# Altium footprint library ref-packages.PCBLIB: 1544 footprints (part 21 of 103)
Each footprint in its own frame and in the unit in brackets; x right, y up, seen from the top. Pads: shape width x height; smd on the part's side, far side on the other; paste and mask are expansions set on the pad; w line width, h text height; cw(c..) or ccw(c..) is an arc to the next point about the centre after c.
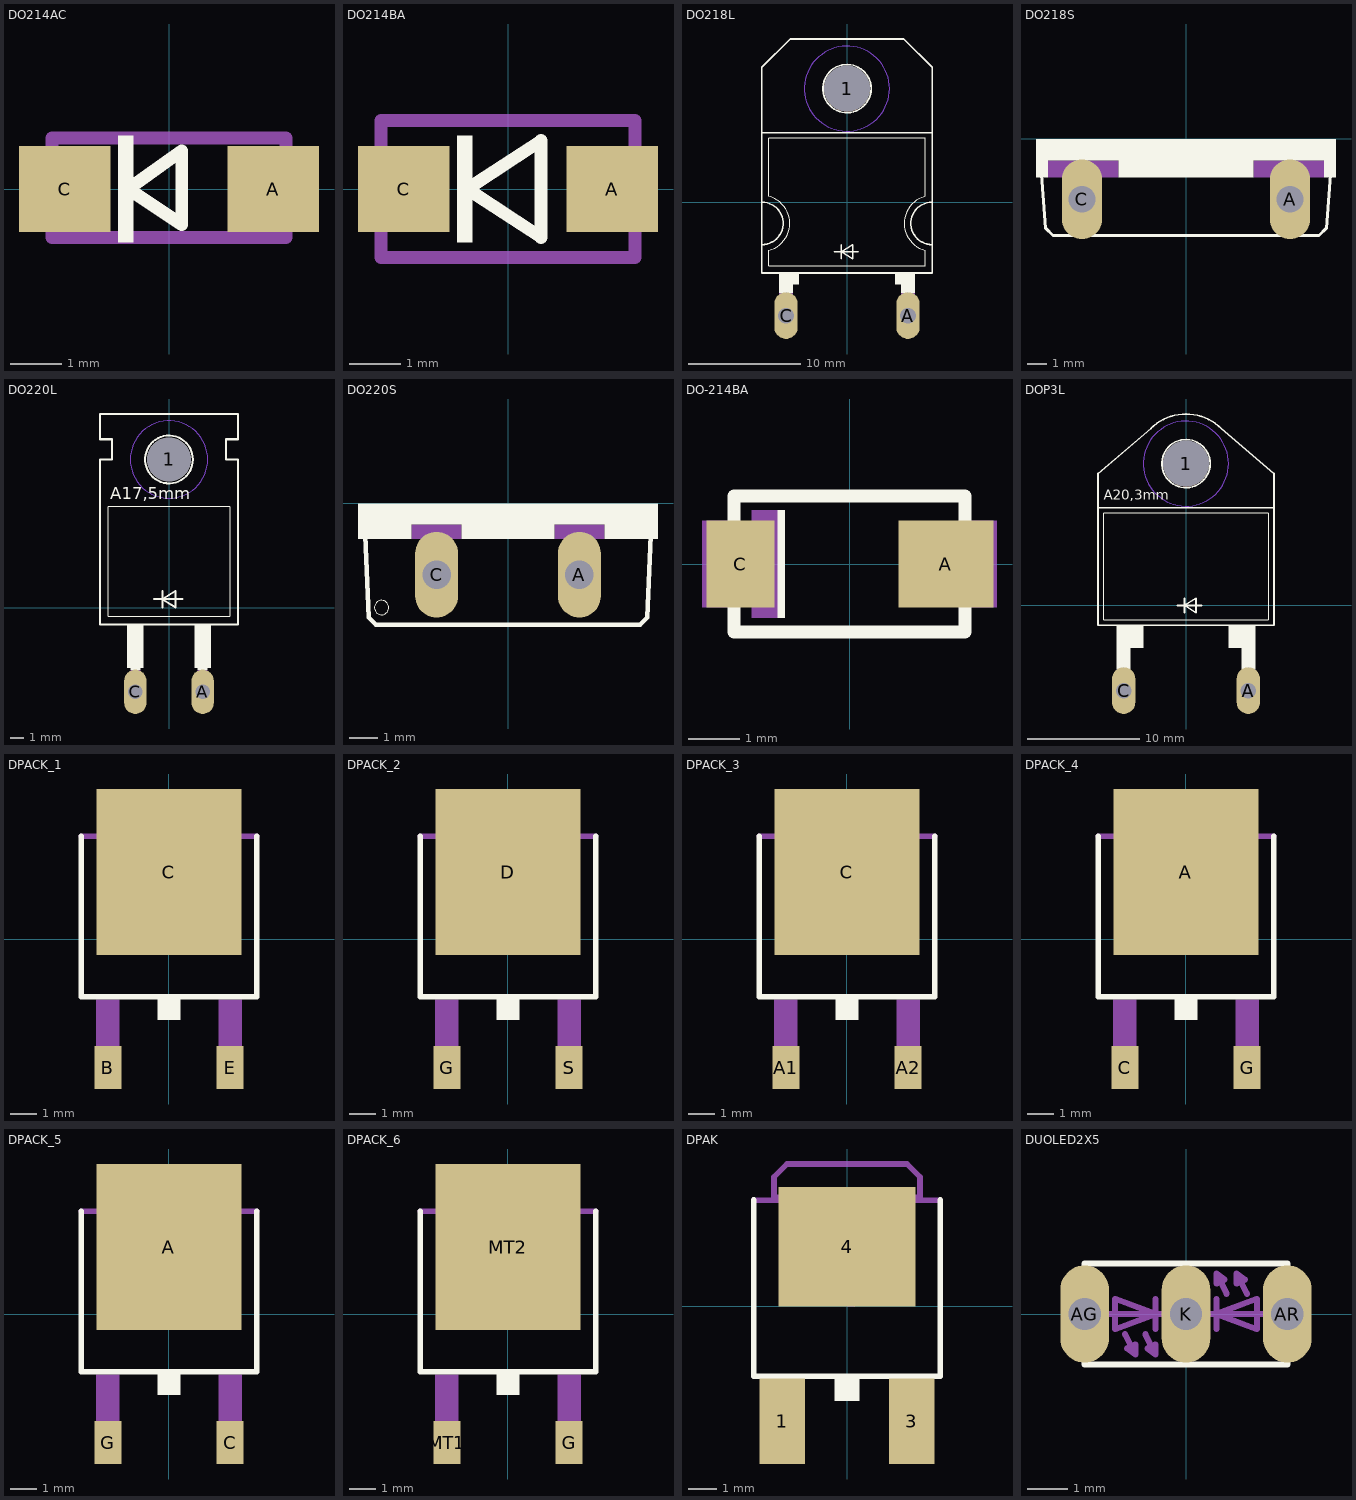
[diagram p20: the footprints below, top view; thin cyan lines are the x and y axes]

## DO214AC [mil]
pads (2):
  rect 70.87x66.93 smd: A(80.71,0) C(-80.71,0)
Top Overlay:
  rectangle: -39.37,-41.34 -27.56,41.34
  lines w10: -31.5,0 9.84,29.53 9.84,-27.56 -31.5,0
Mechanical 16:
  rectangle: -104.33,-27.56 -94.49,25.59
  rectangle: 94.49,-27.56 104.33,25.59
  lines w10: -90.55,-37.4 90.55,-37.4 90.55,39.37 -90.55,39.37 -90.55,-37.4

## DO214BA [mil]
pads (2):
  rect 70.87x66.93 smd: A(80.71,0) C(-80.71,0)
Top Overlay:
  rectangle: -39.37,-41.34 -27.56,41.34
  lines w10: -31.5,0 25.59,37.4 25.59,-37.4 -31.5,0
Mechanical 16:
  rectangle: -112.2,-27.56 -102.36,25.59
  rectangle: 102.36,-27.56 112.2,25.59
  lines w10: -98.43,-53.15 98.43,-53.15 98.43,53.15 -98.43,53.15 -98.43,-53.15

## DO218L [mil]
pads (3):
  round 162 hole 162: 1(0,400)
  oval 82.5x165 hole 55: A(215,-400) C(-215,-400)
Bottom Layer keep-out:
  circle w0: c0,400 r150
Top Overlay:
  circle w6: c0,400 r85
  rectangle: -240,-290 -170,-250
  rectangle: 170,-290 240,-250
  rectangle: -240,-320 -190,-250
  rectangle: 190,-320 240,-250
  lines w2: 273.71,19.65 ccw(c300,-75) 275,-169.99 275,-225 -275,-225 -275,-170 ccw(c-300,-75) -275,20 -275,225 275,225 275,20
  lines w6: -45,-175 -20,-175 ; -20,-200 -20,-175 ; -20,-150 -20,-175 ; 40,-175 -20,-175 ; -300,-150 -300,-250 300,-250 300,-150 ; -300,-150 -300,0 ; -300,-150 ccw(c-300,-75) -300,0 ; -300,0 -300,245 ; -300,245 300,245 ; -300,245 -300,475 -200,575 200,575 300,475 300,245 ; -20,-175 20,-200 20,-150 -20,-175 ; 300,-150 300,0 ; 300,-150 cw(c300,-75) 300,0 ; 300,0 300,245
Mechanical 16:
  rectangle: -240,-400 -190,-320
  rectangle: 190,-400 240,-320
Via Holes:
  circle w0: c0,400 r150

## DO218S [mil]
pads (2):
  oval 82.5x165 hole 55: A(215,-125) C(-215,-125)
Top Overlay:
  rectangle: -310,-45 310,0
  rectangle: -310,-80 -285,-45
  rectangle: 285,-80 310,-45
  rectangle: -140,-80 140,-45
  lines w6: -300,-60 -290,-185 -275,-200 275,-200 290,-185 300,-60
Mechanical 16:
  rectangle: 140,-80 285,-45
  rectangle: -285,-80 -140,-45

## DO220L [mil]
pads (3):
  round 130 hole 130: 1(0,440)
  oval 66x132 hole 44: A(100,-250) C(-100,-250)
Bottom Layer keep-out:
  circle w0: c0,440 r115
Top Overlay:
  circle w6: c0,440 r71
  rectangle: -125,-180 -75,-50
  rectangle: 75,-180 125,-50
  rectangle: 85,-185 115,-180
  rectangle: -115,-185 -85,-180
  lines w2: -180,-25 180,-25 180,300 -180,300 -180,-25
  lines w6: -45,25 -20,25 ; -20,0 -20,25 ; -20,50 -20,25 ; 40,25 -20,25 ; -20,25 20,0 20,50 -20,25 ; -205,-50 205,-50 205,440 170,440 170,500 205,500 205,575 -205,575 -205,500 -170,500 -170,440 -205,440 -205,-50
  text "A17,5mm" at -175,310 h60.45
Mechanical 16:
  rectangle: 85,-250 115,-185
  rectangle: -115,-250 -85,-185
Via Holes:
  circle w0: c0,440 r115

## DO220S [mil]
pads (2):
  oval 60x120 hole 40: A(100,-100) C(-100,-100)
Top Overlay:
  circle w0: c-177,-146 r10
  rectangle: -210,-30 210,0
  rectangle: -210,-50 -135,-30
  rectangle: 135,-50 210,-30
  rectangle: -65,-50 65,-30
  lines w6: -200,-45 -195,-160 -185,-170 185,-170 195,-160 200,-45
Mechanical 16:
  rectangle: -135,-50 -65,-30
  rectangle: 65,-50 135,-30

## DO-214BA [mil]
pads (2):
  rect 72.83x66.14 smd: A(73.62,0)
  rect 51.97x66.14 smd: C(-83.46,0)
Top Overlay:
  rectangle: -55.12,-41.34 -49.21,41.34
  lines w10: -88.19,-51.97 88.19,-51.97 88.19,51.97 -88.19,51.97 -88.19,-51.97
Mechanical 16:
  rectangle: -112.6,-33.07 -91.34,33.07
  rectangle: 92.13,-33.07 112.6,33.07
  rectangle: -74.8,-41.34 -49.21,41.34

## DOP3L [mil]
pads (3):
  round 162 hole 162: 1(0,500)
  oval 82.5x165 hole 55: A(220,-300) C(-220,-300)
Bottom Layer keep-out:
  circle w0: c0,500 r150
Top Overlay:
  circle w6: c0,500 r85
  rectangle: -245,-150 -150,-70
  rectangle: 150,-150 245,-70
  rectangle: -245,-225 -195,-150
  rectangle: 195,-225 245,-150
  lines w2: -290,-50 290,-50 290,325 -290,325 -290,-50
  lines w6: -123.74,623.74 cw(c0.01,500) 0,675 cw(c-0.01,500) 123.74,623.74 ; -123,624 -310,465 -310,345 ; -30,0 -5,0 ; -5,-25 -5,0 ; -5,25 -5,0 ; 55,0 -5,0 ; 123,625 310,465 310,345 ; -310,345 -310,-70 310,-70 310,345 ; -310,345 310,345 ; -5,0 35,-25 35,25 -5,0
  text "A20,3mm" at -290,360 h60.45
Mechanical 16:
  rectangle: -245,-300 -195,-225
  rectangle: 195,-300 245,-225
Via Holes:
  circle w0: c0,500 r150

## DPACK_1 [mm]
pads (3):
  rect 1x1.6 smd: B(-2.28,-4.8) E(2.28,-4.8)
  rect 5.4x6.2 smd: C(0,2.5)
Top Overlay:
  rectangle: -0.432,-3.023 0.432,-2.261
  lines w0.203: -3.277,3.835 -3.277,-2.159 3.277,-2.159 3.277,3.835
Mechanical 16:
  rectangle: -2.718,-5.156 -1.854,-2.261
  rectangle: 1.854,-5.156 2.718,-2.261
  region: 0,0 0.254,0 0.254,0.254 0,0.254
  lines w0.203: -3.277,3.835 3.277,3.835 ; -2.565,3.937 -2.565,4.648 -2.108,5.105 2.108,5.105 2.565,4.648 2.565,3.937 -2.565,3.937

## DPACK_2 [mm]
pads (3):
  rect 5.4x6.2 smd: D(0,2.5)
  rect 1x1.6 smd: G(-2.28,-4.8) S(2.28,-4.8)
Top Overlay:
  rectangle: -0.432,-3.023 0.432,-2.261
  lines w0.203: -3.277,3.835 -3.277,-2.159 3.277,-2.159 3.277,3.835
Mechanical 16:
  rectangle: -2.718,-5.156 -1.854,-2.261
  rectangle: 1.854,-5.156 2.718,-2.261
  region: 0,0 0.254,0 0.254,0.254 0,0.254
  lines w0.203: -3.277,3.835 3.277,3.835 ; -2.565,3.937 -2.565,4.648 -2.108,5.105 2.108,5.105 2.565,4.648 2.565,3.937 -2.565,3.937

## DPACK_3 [mm]
pads (3):
  rect 1x1.6 smd: A1(-2.28,-4.8) A2(2.28,-4.8)
  rect 5.4x6.2 smd: C(0,2.5)
Top Overlay:
  rectangle: -0.432,-3.023 0.432,-2.261
  lines w0.203: -3.277,3.835 -3.277,-2.159 3.277,-2.159 3.277,3.835
Mechanical 16:
  rectangle: -2.718,-5.156 -1.854,-2.261
  rectangle: 1.854,-5.156 2.718,-2.261
  region: 0,0 0.254,0 0.254,0.254 0,0.254
  lines w0.203: -3.277,3.835 3.277,3.835 ; -2.565,3.937 -2.565,4.648 -2.108,5.105 2.108,5.105 2.565,4.648 2.565,3.937 -2.565,3.937

## DPACK_4 [mm]
pads (3):
  rect 5.4x6.2 smd: A(0,2.5)
  rect 1x1.6 smd: C(-2.28,-4.8) G(2.28,-4.8)
Top Overlay:
  rectangle: -0.432,-3.023 0.432,-2.261
  lines w0.203: -3.277,3.835 -3.277,-2.159 3.277,-2.159 3.277,3.835
Mechanical 16:
  rectangle: -2.718,-5.156 -1.854,-2.261
  rectangle: 1.854,-5.156 2.718,-2.261
  region: 0,0 0.254,0 0.254,0.254 0,0.254
  lines w0.203: -3.277,3.835 3.277,3.835 ; -2.565,3.937 -2.565,4.648 -2.108,5.105 2.108,5.105 2.565,4.648 2.565,3.937 -2.565,3.937

## DPACK_5 [mm]
pads (3):
  rect 5.4x6.2 smd: A(0,2.5)
  rect 1x1.6 smd: C(2.28,-4.8) G(-2.28,-4.8)
Top Overlay:
  rectangle: -0.432,-3.023 0.432,-2.261
  lines w0.203: -3.277,3.835 -3.277,-2.159 3.277,-2.159 3.277,3.835
Mechanical 16:
  rectangle: -2.718,-5.156 -1.854,-2.261
  rectangle: 1.854,-5.156 2.718,-2.261
  region: 0,0 0.254,0 0.254,0.254 0,0.254
  lines w0.203: -3.277,3.835 3.277,3.835 ; -2.565,3.937 -2.565,4.648 -2.108,5.105 2.108,5.105 2.565,4.648 2.565,3.937 -2.565,3.937

## DPACK_6 [mm]
pads (3):
  rect 1x1.6 smd: G(2.28,-4.8) MT1(-2.28,-4.8)
  rect 5.4x6.2 smd: MT2(0,2.5)
Top Overlay:
  rectangle: -0.432,-3.023 0.432,-2.261
  lines w0.203: -3.277,3.835 -3.277,-2.159 3.277,-2.159 3.277,3.835
Mechanical 16:
  rectangle: -2.718,-5.156 -1.854,-2.261
  rectangle: 1.854,-5.156 2.718,-2.261
  region: 0,0 0.254,0 0.254,0.254 0,0.254
  lines w0.203: -3.277,3.835 3.277,3.835 ; -2.565,3.937 -2.565,4.648 -2.108,5.105 2.108,5.105 2.565,4.648 2.565,3.937 -2.565,3.937

## DPAK [mil]
pads (3):
  rect 62.99x118.11 smd: 1(-89.76,-159.06) 3(89.76,-159.06)
  rect 190x165 smd: 4(0,82.52)
Top Overlay:
  rectangle: -17,-130.81 17,-100.81
  lines w8: -129,147.06 -129.02,-96.81 129.02,-96.81 129,147.06
Mechanical 16:
  rectangle: -107,-214.81 -73,-100.81
  rectangle: 73,-214.81 107,-100.81
  region: 0,0 10,0 10,10 0,10
  lines w8: -129.02,147.05 129.03,147.03 ; -101,151.06 -101,179.06 -83,197.06 83,197.06 101,179.06 101,151.06 -101,151.06

## DUOLED2X5 [mil]
pads (3):
  oval 48x96 hole 32: AG(-100,0) AR(100,0) K(0,0)
Top Overlay:
  lines w6: -100,-35 -100,-50 100,-50 100,-35 ; -100,35 -100,50 100,50 100,35
Mechanical 16:
  lines w6: -100,-35 -100,35 ; -85,0 -30,0 ; -60,-20 -50,-40 ; -40,-20 -30,-40 ; -30,-15 -30,0 ; -30,15 -30,0 ; 30,-15 30,0 ; 30,15 30,0 ; 40,20 30,40 ; 60,20 50,40 ; 85,0 30,0 ; 100,-35 100,35 ; -50,-40 -50,-30 -58,-34 -50,-40 ; -30,-40 -30,-30 -38,-34 -30,-40 ; -30,0 -70,15 -70,-15 -30,0 ; -30,0 30,0 ; 30,0 70,-15 70,15 30,0 ; 30,40 30,30 38,34 30,40 ; 50,40 50,30 58,34 50,40